# Altium footprint library Indruino.PcbLib: 383 footprints (part 8 of 24)
Each footprint in its own frame and in the unit in brackets; x right, y up, seen from the top. Pads: shape width x height; smd on the part's side, far side on the other; paste and mask are expansions set on the pad; w line width, h text height; cw(c..) or ccw(c..) is an arc to the next point about the centre after c.
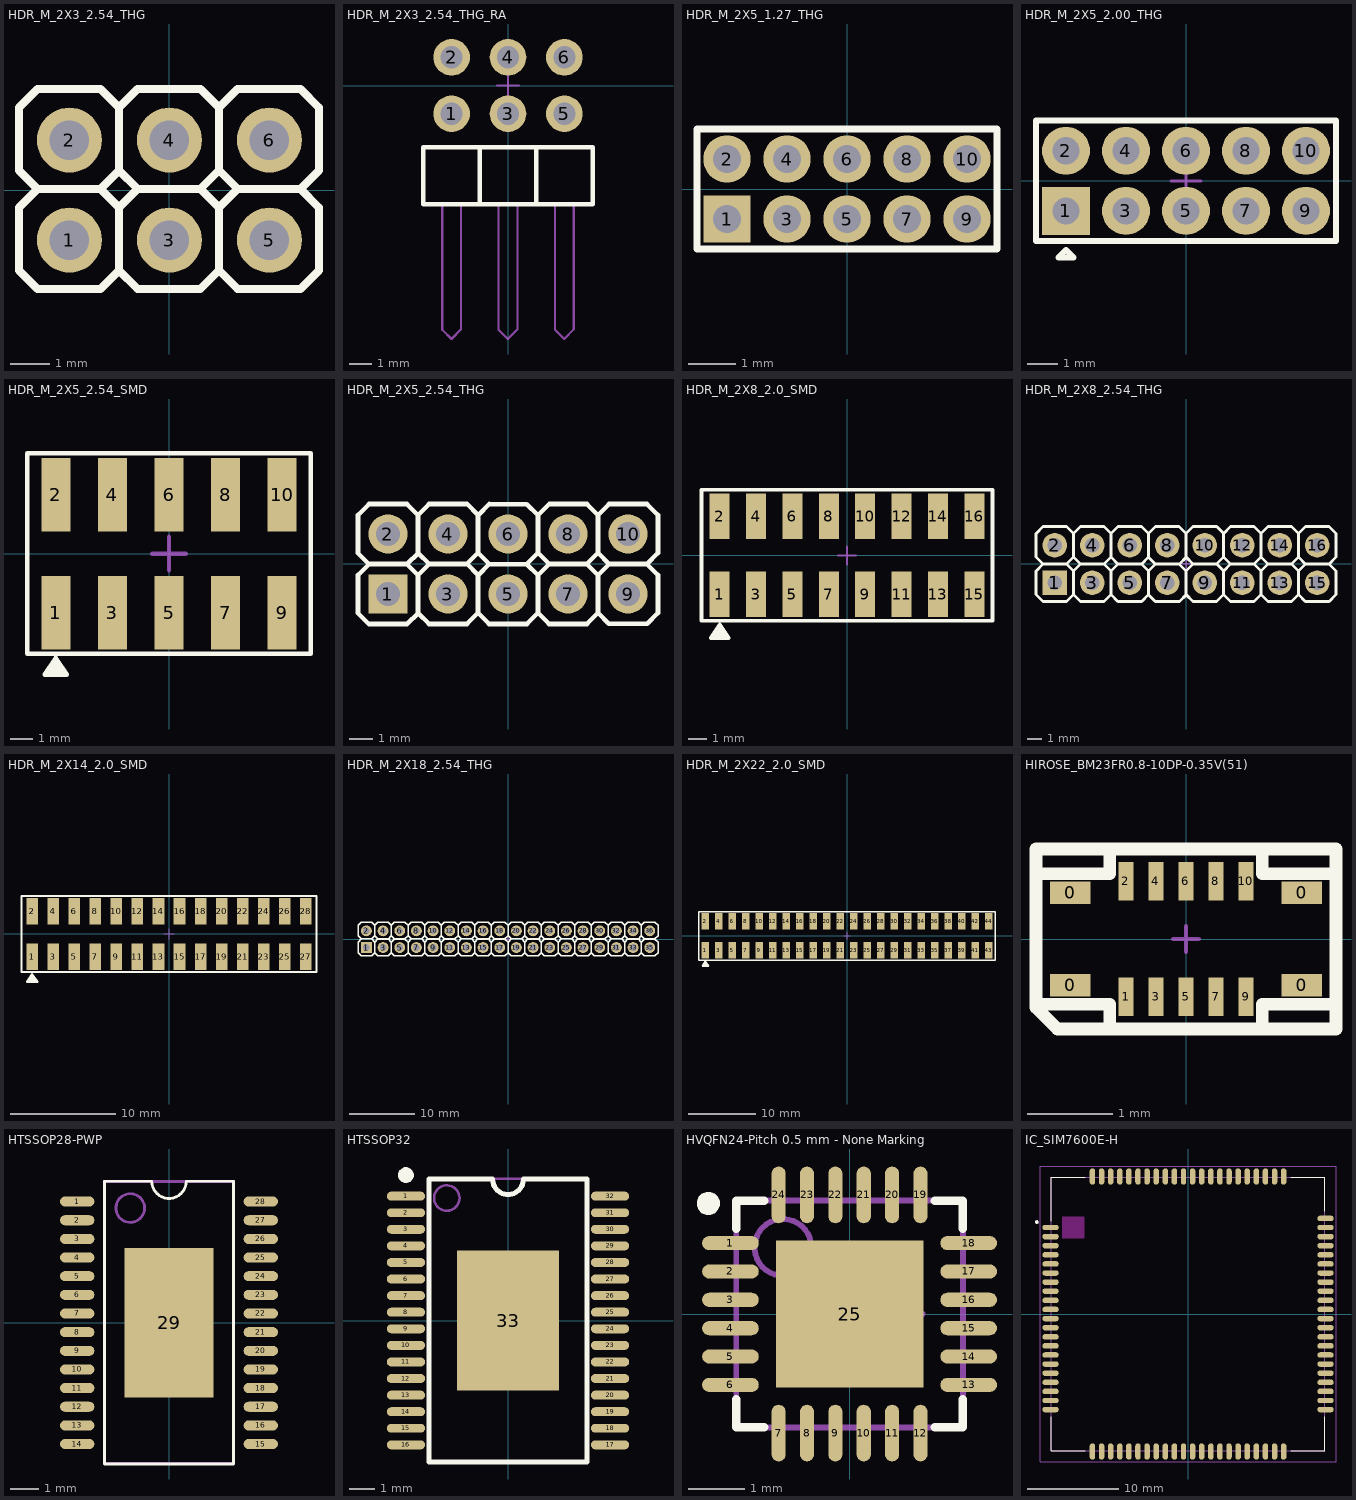
[diagram p7: the footprints below, top view; thin cyan lines are the x and y axes]

## HDR_M_2X3_2.54_THG [mm]
pads (6):
  round 1.65 hole 1: 1(-2.54,-1.27) 2(-2.54,1.27) 3(0,-1.27) 4(0,1.27) 5(2.54,-1.27) 6(2.54,1.27)
Top Overlay:
  lines w0.2: -1.28,-2.075 -1.28,-0.44 ; -1.28,0.465 -1.28,2.1 ; -0.813,-2.508 -1.28,-2.04 -1.75,-2.51 -3.35,-2.51 -3.82,-2.04 -3.82,-0.44 -3.35,0.03 ; -0.813,0.032 -1.28,0.5 -1.75,0.03 ; -0.808,-2.513 0.783,-2.513 1.26,-2.035 ; -0.808,0.027 0.783,0.027 1.26,0.505 ; 1.733,-2.508 1.26,-2.035 ; 1.733,0.032 1.26,0.505 ; 1.735,-2.51 3.33,-2.51 3.8,-2.04 3.8,-0.445 3.327,0.027 1.727,0.027 1.26,-0.44 ; 1.735,0.03 3.33,0.03 3.8,0.5 3.8,2.095 3.327,2.567 1.727,2.567 1.26,2.1 ; -3.35,0.03 -1.75,0.03 ; -3.35,0.03 -3.82,0.5 -3.82,2.1 -3.35,2.57 -1.75,2.57 -1.28,2.1 ; -3.35,0.03 -1.75,0.03 ; -1.75,0.03 -1.28,-0.44 ; -1.28,-0.44 -0.81,0.03 0.79,0.03 1.26,-0.44 ; -1.28,2.1 -0.81,2.57 0.79,2.57 1.26,2.1 ; 1.26,-2.035 1.26,-0.44 ; 1.26,0.505 1.26,2.1
3D body "header_3x1pin_male.stp": height 8.54, standoff -3, extent -3.8,0.01 3.82,2.55
3D body "header_3x1pin_male.stp": height 8.54, standoff -3, extent -3.8,-2.53 3.82,0.01

## HDR_M_2X3_2.54_THG_RA [mm]
pads (6):
  round 1.65 hole 1: 1(-2.54,-1.27) 2(-2.54,1.27) 3(0,-1.27) 4(0,1.27) 5(2.54,-1.27) 6(2.54,1.27)
Top Overlay:
  lines w0.2: -1.27,-5.32 -1.27,-2.79 ; 1.27,-5.33 1.27,-2.79 ; -3.81,-5.35 -3.81,-2.79 3.81,-2.79 3.81,-5.35 -3.81,-5.35
Mechanical 13:
  lines w0.1: -2.963,-5.36 -2.963,-11.007 -2.55,-11.42 -2.117,-10.987 -2.117,-5.36 ; -1.27,-5.33 -1.27,-2.8 ; -0.423,-5.36 -0.423,-11.007 -0.01,-11.42 0.423,-10.987 0.423,-5.36 ; 1.27,-5.34 1.27,-2.8 ; 2.117,-5.36 2.117,-11.007 2.53,-11.42 2.963,-10.987 2.963,-5.36 ; -3.81,-5.36 3.81,-5.36 3.81,-2.8 -3.81,-2.8 -3.81,-5.36
Mechanical 15:
  lines w0.1: -0.5,0 0.5,0 ; 0,-0.5 0,0.5
3D body "header_bi_row_right_angle_male.stp": height 4.98, standoff -2.98, extent -3.81,-11.345 -1.27,1.575
3D body "header_bi_row_right_angle_male.stp": height 4.98, standoff -2.98, extent -1.27,-11.345 1.27,1.575
3D body "header_bi_row_right_angle_male.stp": height 4.98, standoff -2.98, extent 1.27,-11.345 3.81,1.575

## HDR_M_2X5_1.27_THG [mm]
pads (10):
  rect 1x1 hole 0.6: 1(-2.54,-0.635)
  round 1 hole 0.6: 2(-2.54,0.635) 3(-1.27,-0.635) 4(-1.27,0.635) 5(0,-0.635) 6(0,0.635) 7(1.27,-0.635) 8(1.27,0.635) 9(2.54,-0.635) 10(2.54,0.635)
Top Overlay:
  lines w0.15: -3.175,-1.27 -3.175,1.27 3.175,1.27 3.175,-1.27 -3.175,-1.27

## HDR_M_2X5_2.00_THG [mm] "CONN HEADER 10POS 2MM GOLD DIP"
pads (10):
  rect 1.6x1.6 hole 0.9: 1(-4,-1)
  round 1.6 hole 0.9: 2(-4,1) 3(-2,-1) 4(-2,1) 5(0,-1) 6(0,1) 7(2,-1) 8(2,1) 9(4,-1) 10(4,1)
Top Overlay:
  lines w0.2: -5,-2 5,-2 5,2 -5,2 -5,-2 ; -4.25,-2.55 -4,-2.3 -3.75,-2.55 -4.25,-2.55
Mechanical 15:
  lines w0.1: -0.5,0 0.5,0 ; 0,-0.5 0,0.5
3D body "A3C-10P-2DSA.stp": height 4.5, standoff -2.5, extent -5,-2 5,2

## HDR_M_2X5_2.54_SMD [mm]
pads (10):
  rect 1.3x3.3 smd: 1(-5.08,-2.65) 2(-5.08,2.65) 3(-2.54,-2.65) 4(-2.54,2.65) 5(0,-2.65) 6(0,2.65) 7(2.54,-2.65) 8(2.54,2.65) 9(5.08,-2.65) 10(5.08,2.65)
Top Overlay:
  region: -5.58,-5.43 -4.58,-5.43 -5.08,-4.68
  lines w0.2: -6.35,-4.5 6.35,-4.5 6.35,4.5 -6.35,4.5 -6.35,-4.5 ; -5.58,-5.43 -4.58,-5.43 -5.08,-4.68 -5.58,-5.43
Mechanical 15:
  lines w0.2: -0.75,0 0.75,0 ; 0,-0.75 0,0.75
3D body "pin_header_a-sl254-dg-g10mp1.stp": height 9.75, standoff 0.01, extent -6.35,-3.75 6.35,3.75

## HDR_M_2X5_2.54_THG [mm]
pads (10):
  rect 1.65x1.65 hole 1: 1(-5.08,-1.27)
  round 1.65 hole 1: 2(-5.08,1.27) 3(-2.54,-1.27) 4(-2.54,1.27) 5(0,-1.27) 6(0,1.27) 7(2.54,-1.27) 8(2.54,1.27) 9(5.08,-1.27) 10(5.08,1.27)
Top Overlay:
  lines w0.2: -5.89,0 -6.35,0.46 -6.35,2.07 -5.88,2.54 -4.28,2.54 -3.81,2.07 ; -4.26,-2.54 -5.89,-2.54 -6.35,-2.08 -6.35,-0.47 -5.88,0 -4.28,0 -3.81,-0.47 ; -4.255,-2.535 -3.8,-2.08 -3.34,-2.54 -1.74,-2.54 -1.27,-2.07 ; -4.255,0.005 -3.8,0.46 -3.34,0 ; -3.81,-2.08 -3.81,-0.47 ; -3.81,0.46 -3.81,2.07 ; -1.74,0 -1.27,0.47 ; -1.27,-0.47 -1.27,-2.07 ; -1.27,2.07 -1.27,0.47 ; -0.8,0 -1.27,0.47 ; -0.79,0 -1.26,-0.47 -1.73,0 -3.34,0 ; -0.79,2.54 -1.26,2.07 -1.73,2.54 -3.34,2.54 -3.81,2.07 ; -0.785,-0.005 0.795,-0.005 1.27,-0.48 ; -0.785,2.535 0.795,2.535 1.27,2.06 ; 0.8,0 1.27,0.47 ; 1.74,0 1.27,0.47 ; 4.275,0.005 3.81,0.47 ; 5.885,0.005 6.35,0.47 6.35,2.07 5.88,2.54 4.28,2.54 3.81,2.07 ; -3.81,-0.47 -3.34,0 ; -1.27,-2.07 -0.8,-2.54 0.8,-2.54 1.27,-2.07 ; 1.27,-2.07 1.27,-0.48 ; 1.27,-2.07 1.74,-2.54 3.34,-2.54 3.81,-2.07 ; 1.27,-0.48 1.75,0 3.34,0 ; 1.27,0.47 1.27,2.06 ; 1.27,2.06 1.75,2.54 3.34,2.54 3.81,2.07 ; 3.34,0 3.81,0.47 ; 3.34,0 3.81,-0.47 ; 3.81,-2.07 4.275,-2.535 5.885,-2.535 6.35,-2.07 6.35,-0.47 5.88,0 4.28,0 3.81,-0.47 ; 3.81,-2.07 3.81,-0.47 ; 3.81,0.47 3.81,2.07
3D body "header_3x1pin_male.stp": height 8.54, standoff -3, extent -1.26,-2.53 6.36,0.01
3D body "header_3x1pin_male.stp": height 8.54, standoff -3, extent -1.26,0.01 6.36,2.55
3D body "header_2x1pin_male.stp": height 8.54, standoff -3, extent -6.33,0.02 -1.25,2.56
3D body "header_2x1pin_male.stp": height 8.54, standoff -3, extent -6.33,-2.52 -1.25,0.02

## HDR_M_2X8_2.0_SMD [mm]
pads (16):
  rect 1.1x2.5 smd: 1(-7,-2.15) 2(-7,2.15) 3(-5,-2.15) 4(-5,2.15) 5(-3,-2.15) 6(-3,2.15) 7(-1,-2.15) 8(-1,2.15) 9(1,-2.15) 10(1,2.15) 11(3,-2.15) 12(3,2.15) 13(5,-2.15) 14(5,2.15) 15(7,-2.15) 16(7,2.15)
Top Overlay:
  region: -7.5,-4.55 -6.5,-4.55 -7,-3.8
  lines w0.2: -8,-3.6 8,-3.6 8,3.6 -8,3.6 -8,-3.6 ; -7.5,-4.55 -6.5,-4.55 -7,-3.8 -7.5,-4.55
Mechanical 15:
  lines w0.1: -0.5,0 0.5,0 ; 0,-0.5 0,0.5
3D body "2.0 MALE HEADER_8X2PINS.STEP": height 7.3, standoff 0, extent -8,-3.3 8,3.3

## HDR_M_2X8_2.54_THG [mm]
pads (16):
  rect 1.65x1.65 hole 1: 1(-8.89,-1.27)
  round 1.65 hole 1: 2(-8.89,1.27) 3(-6.35,-1.27) 4(-6.35,1.27) 5(-3.81,-1.27) 6(-3.81,1.27) 7(-1.27,-1.27) 8(-1.27,1.27) 9(1.27,-1.27) 10(1.27,1.27) 11(3.81,-1.27) 12(3.81,1.27) 13(6.35,-1.27) 14(6.35,1.27) 15(8.89,-1.27) 16(8.89,1.27)
Top Overlay:
  lines w0.2: -10.16,-0.47 -10.16,-2.07 -9.69,-2.54 -8.09,-2.54 -7.62,-2.07 ; -10.16,2.07 -10.16,0.47 -9.69,0 ; -10.15,-0.47 -9.68,0 ; -10.15,2.07 -9.68,2.54 ; -9.675,-0.005 -8.095,-0.005 -7.62,-0.48 ; -9.675,2.535 -8.095,2.535 -7.62,2.06 ; -8.09,0 -7.62,0.47 ; -7.15,0 -7.62,0.47 ; -4.615,0.005 -5.08,0.47 ; -3.005,0.005 -2.54,0.47 ; -2.54,-2.08 -2.08,-2.54 -0.45,-2.54 ; -2.08,0 -2.54,0.46 -2.54,2.07 ; -0.445,-2.535 0.01,-2.08 0.47,-2.54 2.07,-2.54 2.54,-2.07 ; -0.445,0.005 0.01,0.46 0.47,0 ; 0,-2.08 0,-0.47 ; 0,0.46 0,2.07 ; 2.07,0 2.54,0.47 ; 2.54,-0.47 2.54,-2.07 ; 2.54,2.07 2.54,0.47 ; 3.01,0 2.54,0.47 ; 3.02,0 2.55,-0.47 2.08,0 0.47,0 ; 3.02,2.54 2.55,2.07 2.08,2.54 0.47,2.54 0,2.07 ; 3.025,-0.005 4.605,-0.005 5.08,-0.48 ; 3.025,2.535 4.605,2.535 5.08,2.06 ; 4.61,0 5.08,0.47 ; 5.55,0 5.08,0.47 ; 8.085,0.005 7.62,0.47 ; 9.695,0.005 10.16,0.47 10.16,2.07 9.69,2.54 8.09,2.54 7.62,2.07 ; -7.62,-2.07 -7.62,-0.48 ; -7.62,-2.07 -7.15,-2.54 -5.55,-2.54 -5.08,-2.07 ; -7.62,-0.48 -7.14,0 -5.55,0 ; -7.62,0.47 -7.62,2.06 ; -7.62,2.06 -7.14,2.54 -5.55,2.54 -5.08,2.07 ; -5.55,0 -5.08,0.47 ; -5.55,0 -5.08,-0.47 ; -5.08,-2.07 -4.615,-2.535 -3.005,-2.535 -2.54,-2.07 -2.54,-0.47 ; -5.08,-2.07 -5.08,-0.47 ; -5.08,-0.47 -4.61,0 -3.01,0 -2.54,-0.47 ; -5.08,0.47 -5.08,2.07 ; -5.08,2.07 -4.61,2.54 -3.01,2.54 -2.54,2.07 ; -2.54,-0.47 -2.07,0 -0.47,0 0,-0.47 ; -2.54,2.07 -2.07,2.54 -0.47,2.54 0,2.07 ; 0,-0.47 0.47,0 ; 2.54,-2.07 3.01,-2.54 4.61,-2.54 5.08,-2.07 ; 5.08,-2.07 5.08,-0.48 ; 5.08,-2.07 5.55,-2.54 7.15,-2.54 7.62,-2.07 ; 5.08,-0.48 5.56,0 7.15,0 ; 5.08,0.47 5.08,2.06 ; 5.08,2.06 5.56,2.54 7.15,2.54 7.62,2.07 ; 7.15,0 7.62,0.47 ; 7.15,0 7.62,-0.47 ; 7.62,-2.07 8.085,-2.535 9.695,-2.535 10.16,-2.07 10.16,-0.47 9.69,0 8.09,0 7.62,-0.47 ; 7.62,-2.07 7.62,-0.47 ; 7.62,0.47 7.62,2.07
Mechanical 15:
  lines w0.1: -0.5,0 0.5,0 ; 0,-0.5 0,0.5
3D body "pin_header_awl254-dg-g16d.stp": height 8.5, standoff -3, extent -10.16,-2.54 10.16,2.54

## HDR_M_2X14_2.0_SMD [mm]
pads (28):
  rect 1.1x2.5 smd: 1(-13,-2.15) 2(-13,2.15) 3(-11,-2.15) 4(-11,2.15) 5(-9,-2.15) 6(-9,2.15) 7(-7,-2.15) 8(-7,2.15) 9(-5,-2.15) 10(-5,2.15) 11(-3,-2.15) 12(-3,2.15) 13(-1,-2.15) 14(-1,2.15) 15(1,-2.15) 16(1,2.15) 17(3,-2.15) 18(3,2.15) 19(5,-2.15) 20(5,2.15) 21(7,-2.15) 22(7,2.15) 23(9,-2.15) 24(9,2.15) 25(11,-2.15) 26(11,2.15) 27(13,-2.15) 28(13,2.15)
Top Overlay:
  region: -13.5,-4.55 -12.5,-4.55 -13,-3.8
  lines w0.2: -14,-3.6 -14,3.6 14,3.6 14,-3.6 -14,-3.6 ; -13.5,-4.55 -13,-3.8 -12.5,-4.55 -13.5,-4.55
Mechanical 15:
  lines w0.1: -0.5,0 0.5,0 ; 0,-0.5 0,0.5
3D body "pin_header_a-sl200-dg-g28mp1.stp": height 6.5, standoff 0, extent -13.975,-3.25 13.975,3.25

## HDR_M_2X18_2.54_THG [mm]
pads (36):
  rect 1.65x1.65 hole 1: 1(-21.59,-1.27)
  round 1.65 hole 1: 2(-21.59,1.27) 3(-19.05,-1.27) 4(-19.05,1.27) 5(-16.51,-1.27) 6(-16.51,1.27) 7(-13.97,-1.27) 8(-13.97,1.27) 9(-11.43,-1.27) 10(-11.43,1.27) 11(-8.89,-1.27) 12(-8.89,1.27) 13(-6.35,-1.27) 14(-6.35,1.27) 15(-3.81,-1.27) 16(-3.81,1.27) 17(-1.27,-1.27) 18(-1.27,1.27) 19(1.27,-1.27) 20(1.27,1.27) 21(3.81,-1.27) 22(3.81,1.27) 23(6.35,-1.27) 24(6.35,1.27) 25(8.89,-1.27) 26(8.89,1.27) 27(11.43,-1.27) 28(11.43,1.27) 29(13.97,-1.27) 30(13.97,1.27) 31(16.51,-1.27) 32(16.51,1.27) 33(19.05,-1.27) 34(19.05,1.27) 35(21.59,-1.27) 36(21.59,1.27)
Top Overlay:
  drawing of 264 lines, arcs and shapes, not listed
Mechanical 15:
  lines w0.1: -0.5,0 0.5,0 ; 0,-0.5 0,0.5
3D body "header_3x1pin_male.stp": height 8.54, standoff -3, extent 15.25,0.01 22.87,2.55
3D body "header_3x1pin_male.stp": height 8.54, standoff -3, extent 15.25,-2.53 22.87,0.01
3D body "header_3x1pin_male.stp": height 8.54, standoff -3, extent 7.63,0.01 15.25,2.55
3D body "header_3x1pin_male.stp": height 8.54, standoff -3, extent 7.63,-2.53 15.25,0.01
3D body "header_3x1pin_male.stp": height 8.54, standoff -3, extent 0.01,0.01 7.63,2.55
3D body "header_3x1pin_male.stp": height 8.54, standoff -3, extent 0.01,-2.53 7.63,0.01
3D body "header_3x1pin_male.stp": height 8.54, standoff -3, extent -7.61,0.01 0.01,2.55
3D body "header_3x1pin_male.stp": height 8.54, standoff -3, extent -7.61,-2.53 0.01,0.01
3D body "header_3x1pin_male.stp": height 8.54, standoff -3, extent -15.23,0.01 -7.61,2.55
3D body "header_3x1pin_male.stp": height 8.54, standoff -3, extent -15.23,-2.53 -7.61,0.01
3D body "header_3x1pin_male.stp": height 8.54, standoff -3, extent -22.85,0.01 -15.23,2.55
3D body "header_3x1pin_male.stp": height 8.54, standoff -3, extent -22.85,-2.53 -15.23,0.01

## HDR_M_2X22_2.0_SMD [mm]
pads (44):
  rect 1.1x2.5 smd: 1(-21,-2.15) 2(-21,2.15) 3(-19,-2.15) 4(-19,2.15) 5(-17,-2.15) 6(-17,2.15) 7(-15,-2.15) 8(-15,2.15) 9(-13,-2.15) 10(-13,2.15) 11(-11,-2.15) 12(-11,2.15) 13(-9,-2.15) 14(-9,2.15) 15(-7,-2.15) 16(-7,2.15) 17(-5,-2.15) 18(-5,2.15) 19(-3,-2.15) 20(-3,2.15) 21(-1,-2.15) 22(-1,2.15) 23(1,-2.15) 24(1,2.15) 25(3,-2.15) 26(3,2.15) 27(5,-2.15) 28(5,2.15) 29(7,-2.15) 30(7,2.15) 31(9,-2.15) 32(9,2.15) 33(11,-2.15) 34(11,2.15) 35(13,-2.15) 36(13,2.15) 37(15,-2.15) 38(15,2.15) 39(17,-2.15) 40(17,2.15) 41(19,-2.15) 42(19,2.15) 43(21,-2.15) 44(21,2.15)
Top Overlay:
  region: -21.5,-4.55 -20.5,-4.55 -21,-3.8
  lines w0.2: -22,-3.6 -22,3.6 22,3.6 22,-3.6 -22,-3.6 ; -21.5,-4.55 -21,-3.8 -20.5,-4.55 -21.5,-4.55
Mechanical 15:
  lines w0.1: -0.5,0 0.5,0 ; 0,-0.5 0,0.5
3D body "pin_header_a-sl200-dg-g44mp1.stp": height 6.5, standoff 0, extent -21.975,-3.25 21.975,3.25

## HIROSE_BM23FR0.8-10DP-0.35V(51) [mm]
pads (14):
  rect 0.47x0.26 smd: 0(-1.35,-0.54) 0(-1.35,0.54) 0(1.35,-0.54) 0(1.35,0.54)
  rect 0.18x0.45 smd: 1(-0.7,-0.675) 2(-0.7,0.675) 3(-0.35,-0.675) 4(-0.35,0.675) 5(0,-0.675) 6(0,0.675) 7(0.35,-0.675) 8(0.35,0.675) 9(0.7,-0.675) 10(0.7,0.675)
Top Overlay:
  lines w0.15: -1.75,-0.762 -0.889,-0.762 -0.889,-1.05 ; -1.75,0.762 -0.889,0.762 -0.889,1.05 ; 0.889,-1.05 0.889,-0.762 1.75,-0.762 ; 0.889,1.05 0.889,0.762 1.75,0.762 ; -1.75,-0.8 -1.75,1.05 1.75,1.05 1.75,-1.05 -1.5,-1.05 -1.75,-0.8
Mechanical 15:
  lines w0.05: -0.15,0 0.15,0 ; 0,-0.15 0,0.15
3D body "BM23FR0.8-10DP-0.35V(51)_4800297051_3d.stp": height 0.63, standoff -0.01, extent -1.725,-0.75 1.725,0.75

## HTSSOP28-PWP [mm]
height 1.2
pads (29):
  oval 1.2x0.35 smd: 1(-3.2,4.225) 2(-3.2,3.575) 3(-3.2,2.925) 4(-3.2,2.275) 5(-3.2,1.625) 6(-3.2,0.975) 7(-3.2,0.325) 8(-3.2,-0.325) 9(-3.2,-0.975) 10(-3.2,-1.625) 11(-3.2,-2.275) 12(-3.2,-2.925) 13(-3.2,-3.575) 14(-3.2,-4.225) 15(3.2,-4.225) 16(3.2,-3.575) 17(3.2,-2.925) 18(3.2,-2.275) 19(3.2,-1.625) 20(3.2,-0.975) 21(3.2,-0.325) 22(3.2,0.325) 23(3.2,0.975) 24(3.2,1.625) 25(3.2,2.275) 26(3.2,2.925) 27(3.2,3.575) 28(3.2,4.225)
  rect 3.1x5.2 smd: 29(0,0)
Top Overlay:
  lines w0.1: -2.25,-4.92 2.25,-4.92 2.25,4.935 0.6,4.935 cw(c0,4.935) -0.6,4.935 -2.25,4.935 -2.25,-4.92
Mechanical 13:
  circle w0.1: c-1.35,4 r0.5
  lines w0.1: -2.25,-4.905 2.25,-4.905 2.25,4.925 -2.25,4.925 -2.25,-4.905
Mechanical 15:
  lines w0.1: -0.5,0 0.5,0 ; 0,-0.5 0,0.5
3D body "User Library-PWP (R-PDSO-G28).STEP": height 1.2, standoff 0, extent -3.315,-4.885 3.305,4.915

## HTSSOP32 [mm]
height 1.2
pads (33):
  oval 1.5x0.35 smd: 1(-4,4.875) 2(-4,4.225) 3(-4,3.575) 4(-4,2.925) 5(-4,2.275) 6(-4,1.625) 7(-4,0.975) 8(-4,0.325) 9(-4,-0.325) 10(-4,-0.975) 11(-4,-1.625) 12(-4,-2.275) 13(-4,-2.925) 14(-4,-3.575) 15(-4,-4.225) 16(-4,-4.875) 17(4,-4.875) 18(4,-4.225) 19(4,-3.575) 20(4,-2.925) 21(4,-2.275) 22(4,-1.625) 23(4,-0.975) 24(4,-0.325) 25(4,0.325) 26(4,0.975) 27(4,1.625) 28(4,2.275) 29(4,2.925) 30(4,3.575) 31(4,4.225) 32(4,4.875)
  rect 4x5.5 smd: 33(0,0)
Top Overlay:
  region: -4,5.4 -4.06,5.4 -4.17,5.446 -4.254,5.53 -4.3,5.64 -4.3,5.7 -4.3,5.76 -4.254,5.87 -4.17,5.954 -4.06,6 -4,6 -3.94,6 -3.83,5.954 -3.746,5.87 -3.7,5.76 -3.7,5.7 -3.7,5.64 -3.746,5.53 -3.83,5.446 -3.94,5.4
  lines w0.2: -0.6,5.535 ccw(c0,5.535) 0.6,5.535 ; -0.6,5.55 -3.1,5.55 -3.1,-5.55 3.1,-5.55 3.1,5.55 0.6,5.55
Mechanical 13:
  circle w0.1: c-2.4,4.8 r0.5
  lines w0.1: -3.1,-5.55 -3.1,5.55 3.1,5.55 3.1,-5.55 -3.1,-5.55
Mechanical 15:
  lines w0.1: -0.5,0 0.5,0 ; 0,-0.5 0,0.5
3D body "User Library-HTSSOP32.step": height 1.08, standoff -0.02, extent -4.113,-5.55 4.105,5.55

## HVQFN24-Pitch 0.5 mm - None Marking [mm] "HVQFN, 24-Leads, Body 4x4mm, Pitch 0.5mm, IPC High Density"
height 0.8
pads (25):
  oval 1x0.25 smd: 1(-2.1,1.25) 2(-2.1,0.75) 3(-2.1,0.25) 4(-2.1,-0.25) 5(-2.1,-0.75) 6(-2.1,-1.25) 13(2.1,-1.25) 14(2.1,-0.75) 15(2.1,-0.25) 16(2.1,0.25) 17(2.1,0.75) 18(2.1,1.25)
  oval 0.25x1 smd: 7(-1.25,-2.1) 8(-0.75,-2.1) 9(-0.25,-2.1) 10(0.25,-2.1) 11(0.75,-2.1) 12(1.25,-2.1) 19(1.25,2.1) 20(0.75,2.1) 21(0.25,2.1) 22(-0.25,2.1) 23(-0.75,2.1) 24(-1.25,2.1)
  rect 2.6x2.6 smd: 25(0,0)
Top Overlay:
  region: -2.49,1.75 -2.53,1.75 -2.603,1.78 -2.659,1.837 -2.69,1.91 -2.69,1.95 -2.69,1.99 -2.659,2.063 -2.603,2.12 -2.53,2.15 -2.49,2.15 -2.45,2.15 -2.376,2.12 -2.32,2.063 -2.29,1.99 -2.29,1.95 -2.29,1.91 -2.32,1.837 -2.376,1.78 -2.45,1.75
  lines w0.15: -2,-1.5 -2,-2 -1.5,-2 ; -2,1.5 -2,2 -1.5,2 ; 1.5,-2 2,-2 2,-1.5 ; 1.5,2 2,2 2,1.5
Mechanical 13:
  circle w0.1: c-1.175,1.175 r0.5
  lines w0.1: -2,-2 -2,2 2,2 2,-2 -2,-2
Mechanical 15:
  circle w0.254: c0,0 r0.1
  lines w0.1: -0.216,0.865 0,1 ; 0.196,0.87 0,1 ; 0.999,-0.176 1.288,0.005 ; 1.004,0.191 1.271,0.014 ; 1.286,0 0,0 0,1
  text "Z" at -0.752,-1.059 h0.7
  text "X" at 0.768,-1.085 h0.7
  text "Y" at -0.954,0.33 h0.7
3D body "QFN24(4X4).STEP": height 0.88, standoff -0.02, extent -2.01,-2.01 2.01,2.01

## IC_SIM7600E-H [mm]
pads (87):
  oval 1.8x0.6 smd: 1(-15.1,9.5) 2(-15.1,8.5) 3(-15.1,7.5) 4(-15.1,6.5) 5(-15.1,5.5) 6(-15.1,4.5) 7(-15.1,3.5) 8(-15.1,2.5) 9(-15.1,1.5) 10(-15.1,0.5) 11(-15.1,-0.5) 12(-15.1,-1.5) 13(-15.1,-2.5) 14(-15.1,-3.5) 15(-15.1,-4.5) 16(-15.1,-5.5) 17(-15.1,-6.5) 18(-15.1,-7.5) 19(-15.1,-8.5) 20(-15.1,-9.5) 41(15.1,-9.5) 42(15.1,-8.5) 43(15.1,-7.5) 44(15.1,-6.5) 45(15.1,-5.5) 46(15.1,-4.5) 47(15.1,-3.5) 48(15.1,-2.5) 49(15.1,-1.5) 50(15.1,-0.5) 51(15.1,0.5) 52(15.1,1.5) 53(15.1,2.5) 54(15.1,3.5) 55(15.1,4.5) 56(15.1,5.5) 57(15.1,6.5) 58(15.1,7.5) 59(15.1,8.5) 60(15.1,9.5) 81(-15.1,-10.5) 82(15.1,-10.5) 85(15.1,10.5)
  oval 0.6x1.8 smd: 21(-9.5,-15.1) 22(-8.5,-15.1) 23(-7.5,-15.1) 24(-6.5,-15.1) 25(-5.5,-15.1) 26(-4.5,-15.1) 27(-3.5,-15.1) 28(-2.5,-15.1) 29(-1.5,-15.1) 30(-0.5,-15.1) 31(0.5,-15.1) 32(1.5,-15.1) 33(2.5,-15.1) 34(3.5,-15.1) 35(4.5,-15.1) 36(5.5,-15.1) 37(6.5,-15.1) 38(7.5,-15.1) 39(8.5,-15.1) 40(9.5,-15.1) 61(9.5,15.1) 62(8.5,15.1) 63(7.5,15.1) 64(6.5,15.1) 65(5.5,15.1) 66(4.5,15.1) 67(3.5,15.1) 68(2.5,15.1) 69(1.5,15.1) 70(0.5,15.1) 71(-0.5,15.1) 72(-1.5,15.1) 73(-2.5,15.1) 74(-3.5,15.1) 75(-4.5,15.1) 76(-5.5,15.1) 77(-6.5,15.1) 78(-7.5,15.1) 79(-8.5,15.1) 80(-9.5,15.1) 83(10.5,-15.1) 84(-10.5,-15.1) 86(-10.5,15.1) 87(10.5,15.1)
Top Overlay:
  circle w0.2: c-16.6,10.1 r0.1
  lines w0.127: -15,-11.3 -15,-15 -11.3,-15 ; -15,10.2 -15,15 -11.3,15 ; 11.3,-15 15,-15 15,-11.3 ; 11.3,15 15,15 15,11.3
Keep-Out Layer:
  region: -11.4,8.3 -13.8,8.3 -13.8,10.7 -11.4,10.7
  region: -11.4,8.3 -13.8,8.3 -13.8,10.7 -11.4,10.7
Mechanical 13:
  circle w0.2: c-16.6,10.1 r0.1
  lines w0.127: -15,-15 -15,15 15,15 15,-15 -15,-15
Mechanical 15:
  lines w0.05: -16.25,-16.25 -16.25,16.25 16.25,16.25 16.25,-16.25 -16.25,-16.25
3D body "User Library-User Library-SIM7600C.step": height 3.19, standoff 0.01, extent -15,-15 15,15